# Altium footprint library Intelliclone.PcbLib: 372 footprints (part 14 of 24)
Each footprint in its own frame and in the unit in brackets; x right, y up, seen from the top. Pads: shape width x height; smd on the part's side, far side on the other; paste and mask are expansions set on the pad; w line width, h text height; cw(c..) or ccw(c..) is an arc to the next point about the centre after c.
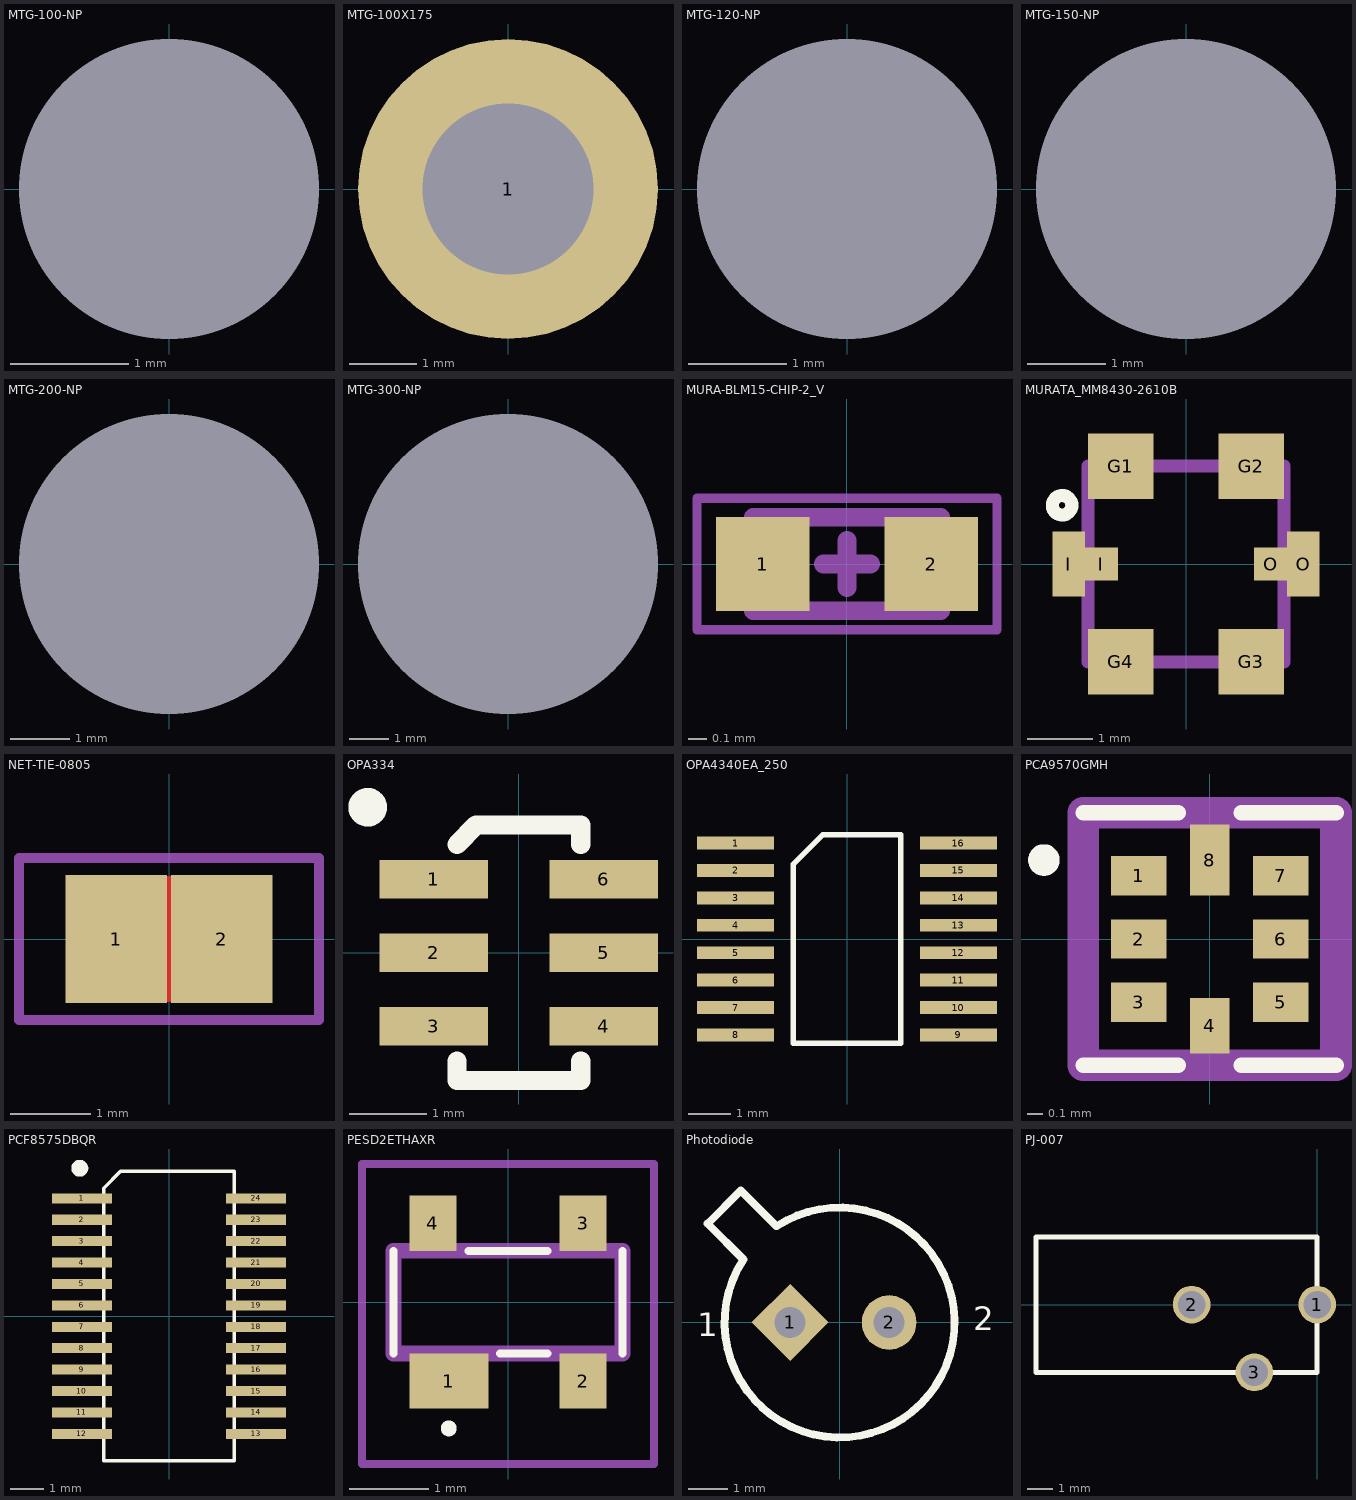
[diagram p13: the footprints below, top view; thin cyan lines are the x and y axes]

## MTG-100-NP [mm] "Non-plated .100\" hole"
pads (1):
  round 0 hole 2.54 unplated paste+0 mask+0: 1(0,0)

## MTG-100X175 [mm] "Plated .100\" hole, .175\" pad"
pads (1):
  round 4.445 hole 2.54: 1(0,0)

## MTG-120-NP [mil] "Non-plated .120\" hole"
pads (1):
  round 0 hole 120 unplated paste+0 mask+0: 1(0,0)

## MTG-150-NP [mm] "Non-plated .150\" hole"
pads (1):
  round 0 hole 3.81 unplated paste+0 mask+0: 1(0,0)

## MTG-200-NP [mm] "Non-plated .200\" hole"
pads (1):
  round 0 hole 5.08 unplated paste+0 mask+0: 1(0,0)

## MTG-300-NP [mm] "Non-plated .300\" hole"
pads (1):
  round 0 hole 7.62 unplated paste+0 mask+0: 1(0,0)

## MURA-BLM15-CHIP-2_V [mm] "Chip Ferrite Bead, 2-Leads, Body 1x0.5mm"
height 0.55
pads (2):
  rect 0.5x0.5 smd: 1(-0.45,0) 2(0.45,0)
Mechanical 13:
  lines w0.1: -0.5,-0.25 0.5,-0.25 0.5,0.25 -0.5,0.25 -0.5,-0.25
Mechanical 15:
  lines w0.05: -0.8,-0.35 0.8,-0.35 0.8,0.35 -0.8,0.35 -0.8,-0.35
  lines w0.1: -0.125,0 0.125,0 ; 0,-0.125 0,0.125
3D body "RESC1005X06L.step": height 0.55, standoff 0, extent -0.525,-0.275 0.525,0.275

## MURATA_MM8430-2610B [mm] "CONN SWD RCPT STR 50 OHM SMD"
pads (8):
  rect 1x1 smd: G1(-1,1.5) G2(1,1.5) G3(1,-1.5) G4(-1,-1.5)
  rect 0.5x1 smd: I(-1.8,0) O(1.8,0)
  rect 0.51x0.5 smd: I(-1.3,0) O(1.3,0)
Top Layer:
  lines w0.127: -1.8,0 -1.8,0.05
Top Overlay:
  circle w0.2: c-1.9,0.9 r0.15
Top Paste:
  region: 0.5,1 0.5,1.75 1.5,1.75 1.5,1
  region: -1.5,1 -1.5,1.752 -0.502,1.752 -0.502,1
  region: 0.499,-1.751 0.499,-1.001 1.501,-1.001 1.501,-1.751
  region: -1.501,-1.751 -1.501,-1 -0.5,-1 -0.5,-1.751
Top Solder:
  region: 0.5,1 0.5,2 1.5,2 1.5,1
  region: -1.5,1 -1.5,2.002 -0.502,2.002 -0.502,1
  region: -2.051,-0.501 -2.051,0.501 -1.551,0.501 -1.551,-0.501
  region: 1.551,-0.499 1.551,0.499 2.051,0.499 2.051,-0.499
  region: 0.499,-2.001 0.499,-1.002 1.502,-1.002 1.502,-2.001
  region: -1.501,-2.001 -1.501,-1 -0.5,-1 -0.5,-2.001
Mechanical 4:
  lines w0.2: -1.5,-1.5 1.5,-1.5 ; -1.5,-1.5 -1.5,1.5 ; -1.5,-1.5 -1.5,1.5 ; -1.5,-1.5 1.5,-1.5 ; -1.5,1.5 1.5,1.5 ; -1.5,1.5 1.5,1.5 ; 1.5,-1.5 1.5,1.5 ; 1.5,-1.5 1.5,1.5
3D body "MM8430-2610RA1--3DModel-STEP-56544.STEP": height 1.9, standoff 0, extent -1.5,-1.5 1.5,1.5

## NET-TIE-0805 [mil] "0805 size net tie"
height 43.31
pads (2):
  rect 50x63 smd: 1(-26,0) 2(26,0)
Top Layer:
  region: -5,31 5,31 5,-31 -5,-31
Mechanical 5:
  lines w5: -74,-40 -74,40 74,40 74,-40 -74,-40
Mechanical 13:
  lines w3.94: -25.59,-28.54 -25.59,28.54 ; 25.59,-28.54 25.59,28.54 ; -43.31,-28.54 -43.31,28.54 43.31,28.54 43.31,-28.54 -43.31,-28.54
3D body: height 43.31, standoff 0, extent 25.61,-28.52 43.29,28.52
3D body: height 43.31, standoff 0, extent -43.29,-28.52 -25.61,28.52

## OPA334 [mm]
pads (6):
  rect 1.4x0.5 smd: 1(-1.1,0.95) 2(-1.1,0) 3(-1.1,-0.95) 4(1.1,-0.95) 5(1.1,0) 6(1.1,0.95)
Top Overlay:
  circle w0.25: c-1.954,1.88 r0.125
  lines w0.249: -0.8,-1.4 -0.8,-1.651 0.8,-1.651 0.8,-1.4 ; -0.8,1.4 -0.551,1.651 0.8,1.651 0.8,1.4
3D body: height 1.45, standoff 0.1, extent -0.838,-1.676 0.838,1.651

## OPA4340EA_250 [mil]
height 53.15
pads (16):
  rect 70.9x11.8 smd: 1(-102.4,88.2) 2(-102.4,63) 3(-102.4,37.8) 4(-102.4,12.6) 5(-102.4,-12.6) 6(-102.4,-37.8) 7(-102.4,-63) 8(-102.4,-88.2) 9(102.4,-88.2) 10(102.4,-63) 11(102.4,-37.8) 12(102.4,-12.6) 13(102.4,12.6) 14(102.4,37.8) 15(102.4,63) 16(102.4,88.2)
Top Overlay:
  lines w5: -49.2,-96 49.2,-96 49.2,96 -22.1,96 -49.2,68.9 -49.2,-96
3D body: height 66, standoff 4, extent -77,-96 77,95

## PCA9570GMH [mm]
pads (8):
  rect 0.35x0.25 smd mask+0.05: 1(-0.45,0.4) 2(-0.45,0) 3(-0.45,-0.4) 5(0.45,-0.4) 6(0.45,0) 7(0.45,0.4)
  rect 0.25x0.35 smd mask+0.05: 4(0,-0.55)
  rect 0.25x0.45 smd mask+0.05: 8(0,0.5)
Top Overlay:
  lines w0.1: -0.8,-0.8 -0.2,-0.8 ; -0.8,0.8 -0.2,0.8 ; 0.2,-0.8 0.8,-0.8 ; 0.2,0.8 0.8,0.8 ; -1.05,0.45 cw(c-1.05,0.5) -1.05,0.55 cw(c-1.05,0.5) -1.05,0.45
Mechanical 15:
  lines w0.2: -0.8,-0.8 -0.8,0.8 0.8,0.8 0.8,-0.8 -0.8,-0.8
3D body "NT3H1101W0FHK.stp": height 0.5, standoff 0, extent -0.85,-0.85 0.85,0.85

## PCF8575DBQR [mil]
height 53.15
pads (24):
  rect 70.9x11.8 smd: 1(-102.4,138.6) 2(-102.4,113.4) 3(-102.4,88.2) 4(-102.4,63) 5(-102.4,37.8) 6(-102.4,12.6) 7(-102.4,-12.6) 8(-102.4,-37.8) 9(-102.4,-63) 10(-102.4,-88.2) 11(-102.4,-113.4) 12(-102.4,-138.6) 13(102.4,-138.6) 14(102.4,-113.4) 15(102.4,-88.2) 16(102.4,-63) 17(102.4,-37.8) 18(102.4,-12.6) 19(102.4,12.6) 20(102.4,37.8) 21(102.4,63) 22(102.4,88.2) 23(102.4,113.4) 24(102.4,138.6)
Top Overlay:
  circle w10: c-105,174 r5
  lines w4.02: -76.8,-170.3 -76.8,150.6 -57.1,170.3 76.8,170.3 76.8,-170.3 -76.8,-170.3
3D body: height 50, standoff 4, extent -77,-170 77,170

## PESD2ETHAXR [mm]
pads (4):
  rect 1x0.7 smd: 1(-0.75,-1)
  rect 0.6x0.7 smd: 2(0.95,-1) 3(0.95,1) 4(-0.95,1)
Top Overlay:
  lines w0.1: -1.45,-0.65 -1.45,0.65 ; -0.5,0.65 0.5,0.65 ; -0.1,-0.65 0.5,-0.65 ; 1.45,-0.65 1.45,0.65 ; -0.8,-1.6 cw(c-0.75,-1.6) -0.7,-1.6 cw(c-0.75,-1.6) -0.8,-1.6
Mechanical 15:
  lines w0.2: -1.45,-0.65 1.45,-0.65 1.45,0.65 -1.45,0.65 -1.45,-0.65
Mechanical 20:
  lines w0.1: -1.85,-2.05 1.85,-2.05 1.85,1.75 -1.85,1.75 -1.85,-2.05
3D body "User Library-SOT143-1.STEP": height 1.22, standoff 0, extent -1.45,-1.181 1.45,1.182

## Photodiode [mm] "Can; 3 Leads; Pin Circle Dia. 2.54 mm; Lead Dia. 0.48 mm (max)"
height 5.33
pads (2):
  rect 1.4x1.4 hole 0.8 rot 45: 1(-1.27,0)
  round 1.4 hole 0.8: 2(1.27,0)
Top Overlay:
  lines w0.2: -3.386,2.537 -2.467,1.618 ccw(c0,0) -1.618,2.467 -2.537,3.386 -3.386,2.537
  text "2" at 3.429,-0.203 h0.61
  text "1" at -3.658,-0.356 h0.61

## PJ-007 [mm] "CONN PWR JACK RT ANG 1.3MM I.D."
height 7.4
pads (3):
  round 1.5 / inner round 1.5 / far side round 1.75 hole 1.1: 1(0,0) 2(-5,0) 3(-2.5,-2.7)
Top Overlay:
  lines w0.2: -11.2,-2.7 -11.2,2.7 0,2.7 0,0 0,-2.7 -11.2,-2.7
3D body "PJ-007.stp": height 7.2, standoff -3.4, extent -11.2,-2.675 0.25,2.675